# Altium schematic symbol library NXP_60_26022015.SCHLIB: 1306 symbols (part 4 of 28) (continued)
## 74HC4049D (continued)
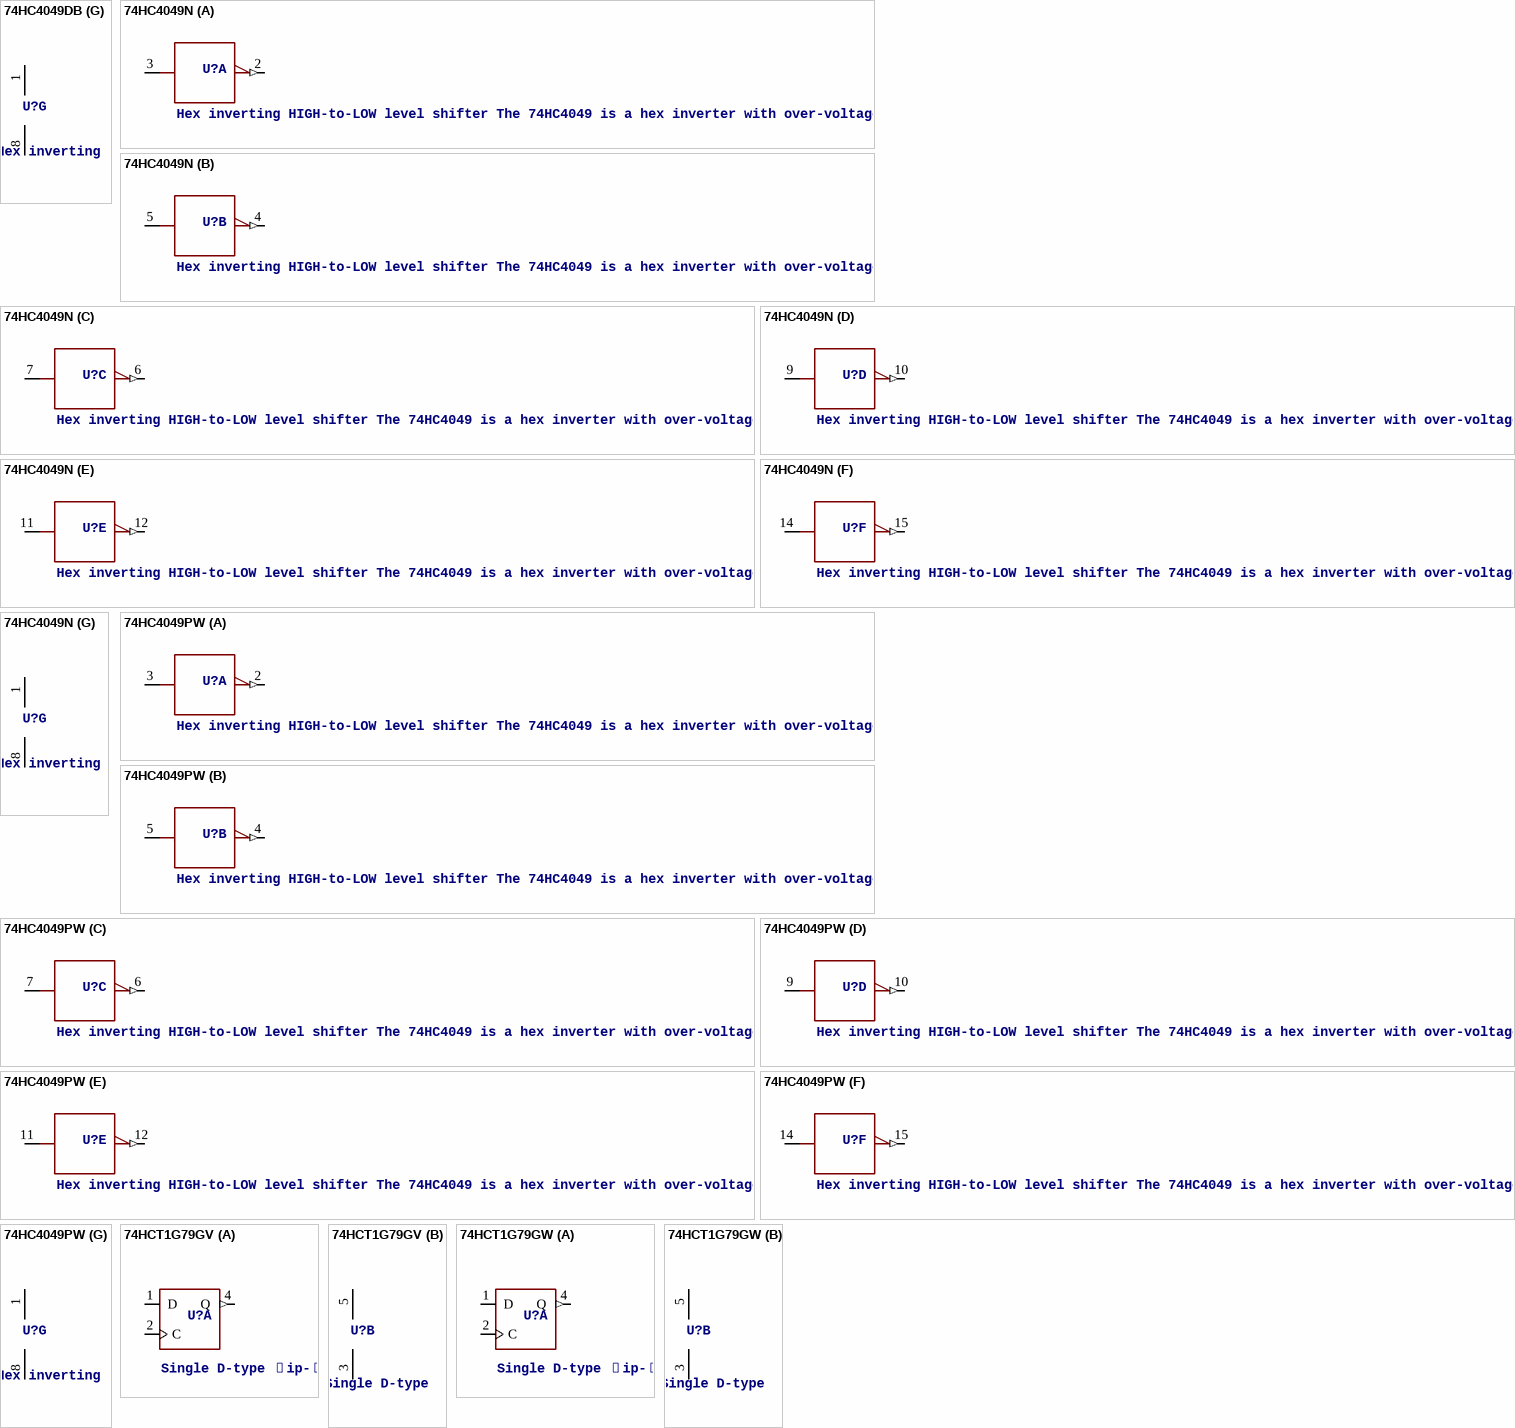
[diagram p18: symbols 74HC4049DB to 74HCT1G79GW]

## 74HC4049DB
designator U?, comment Hex inverting HIGH-to-LOW level shifter The 74HC4049 is a hex inverter with over-voltage tolerant inputs. Inputs are overvoltage tolerant to 15 V. This enables the device to be used in HIGH-to-LOW level shifting applications.    AAL Eindhoven MK
footprint SOT338
part A pins: 2 Y (out), 3 A
part B pins: 4 Y (out), 5 A
part C pins: 6 Y (out), 7 A
part D pins: 9 A, 10 Y (out)
part E pins: 11 A, 12 Y (out)
part F pins: 14 A, 15 Y (out)
part G pins: 1 VCC (power), 8 GND (power)

## 74HC4049N
designator U?, comment Hex inverting HIGH-to-LOW level shifter The 74HC4049 is a hex inverter with over-voltage tolerant inputs. Inputs are overvoltage tolerant to 15 V. This enables the device to be used in HIGH-to-LOW level shifting applications.    AAL Eindhoven MK
footprint SOT38
part A pins: 2 Y (out), 3 A
part B pins: 4 Y (out), 5 A
part C pins: 6 Y (out), 7 A
part D pins: 9 A, 10 Y (out)
part E pins: 11 A, 12 Y (out)
part F pins: 14 A, 15 Y (out)
part G pins: 1 VCC (power), 8 GND (power)

## 74HC4049PW
designator U?, comment Hex inverting HIGH-to-LOW level shifter The 74HC4049 is a hex inverter with over-voltage tolerant inputs. Inputs are overvoltage tolerant to 15 V. This enables the device to be used in HIGH-to-LOW level shifting applications.    AAL Eindhoven MK
footprint SOT403-1
part A pins: 2 Y (out), 3 A
part B pins: 4 Y (out), 5 A
part C pins: 6 Y (out), 7 A
part D pins: 9 A, 10 Y (out)
part E pins: 11 A, 12 Y (out)
part F pins: 14 A, 15 Y (out)
part G pins: 1 VCC (power), 8 GND (power)

## 74HCT1G79GV
designator U?, comment Single D-type ﬂip-ﬂop; positive-edge trigger 74AHC1G79 and 74AHCT1G79 are high-speed Si-gate CMOS devices. They provide a single positive-edge triggered D-type ﬂip-ﬂop. Information on the data input is transferred to the Q output on the LOW-to-HIGH transition of the clock pulse. The D input must be stable one set-up time prior to the LOW-to-HIGH clock transition for predictable operation. The AHC device has CMOS input switching levels and supply voltage range 2 V to 5.5 V. The AHCT device has TTL input switching levels and supply voltage range 4.5 V to 5.5 V    AAL Eindhoven MK
footprint SOT753
part A pins: 1 D, 2 C, 4 Q (out)
part B pins: 3 GND (power), 5 VCC (power)

## 74HCT1G79GW
designator U?, comment Single D-type ﬂip-ﬂop; positive-edge trigger 74AHC1G79 and 74AHCT1G79 are high-speed Si-gate CMOS devices. They provide a single positive-edge triggered D-type ﬂip-ﬂop. Information on the data input is transferred to the Q output on the LOW-to-HIGH transition of the clock pulse. The D input must be stable one set-up time prior to the LOW-to-HIGH clock transition for predictable operation. The AHC device has CMOS input switching levels and supply voltage range 2 V to 5.5 V. The AHCT device has TTL input switching levels and supply voltage range 4.5 V to 5.5 V    AAL Eindhoven MK
footprint SOT353-1
part A pins: 1 D, 2 C, 4 Q (out)
part B pins: 3 GND (power), 5 VCC (power)

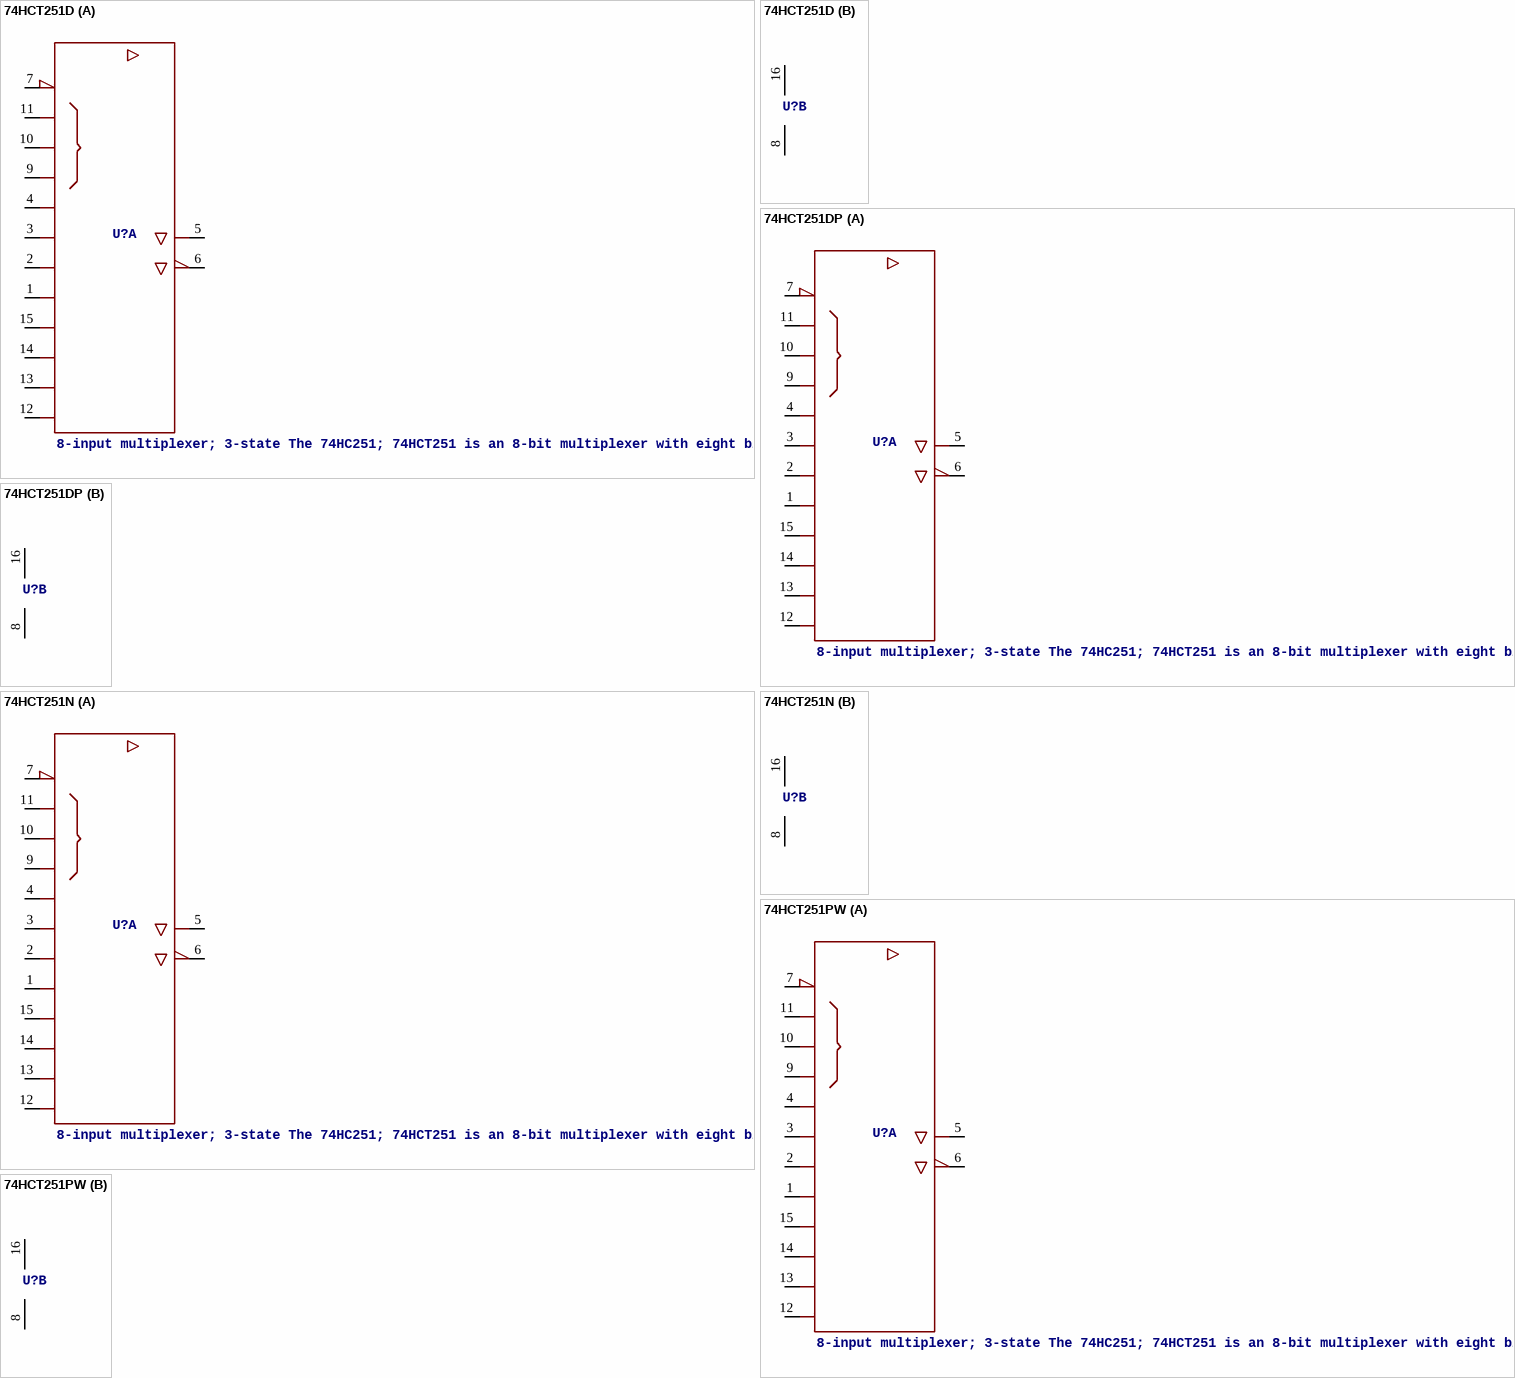
[diagram p19: symbols 74HCT251D to 74HCT251PW]

## 74HCT251D
designator U?, comment 8-input multiplexer; 3-state The 74HC251; 74HCT251 is an 8-bit multiplexer with eight binary inputs (I0 to I7), three select inputs (S0 to S2) and an output enable input (OE). The select inputs select one of the eight binary inputs and route it to the complementary outputs (Y and Y). A HIGH on OE causes the outputs to assume a high-impedance OFF-state. Inputs include clamp diodes that enable the use of current limiting resistors to interface inputs to voltages in excess of VCC.    AAL Eindhoven MK
footprint SOT109-1
part A pins: 1 D3, 2 D2, 3 D1, 4 D0, 5 Y (hiz), 6 W (hiz), 7 !G, 9 C, 10 B, 11 A, 12 D7, 13 D6, 14 D5, 15 D4
part B pins: 8 GND (power), 16 VCC (power)

## 74HCT251DP
designator U?, comment 8-input multiplexer; 3-state The 74HC251; 74HCT251 is an 8-bit multiplexer with eight binary inputs (I0 to I7), three select inputs (S0 to S2) and an output enable input (OE). The select inputs select one of the eight binary inputs and route it to the complementary outputs (Y and Y). A HIGH on OE causes the outputs to assume a high-impedance OFF-state. Inputs include clamp diodes that enable the use of current limiting resistors to interface inputs to voltages in excess of VCC.    AAL Eindhoven MK
footprint SOT338
part A pins: 1 D3, 2 D2, 3 D1, 4 D0, 5 Y (hiz), 6 W (hiz), 7 !G, 9 C, 10 B, 11 A, 12 D7, 13 D6, 14 D5, 15 D4
part B pins: 8 GND (power), 16 VCC (power)

## 74HCT251N
designator U?, comment 8-input multiplexer; 3-state The 74HC251; 74HCT251 is an 8-bit multiplexer with eight binary inputs (I0 to I7), three select inputs (S0 to S2) and an output enable input (OE). The select inputs select one of the eight binary inputs and route it to the complementary outputs (Y and Y). A HIGH on OE causes the outputs to assume a high-impedance OFF-state. Inputs include clamp diodes that enable the use of current limiting resistors to interface inputs to voltages in excess of VCC.    AAL Eindhoven MK
footprint SOT38
part A pins: 1 D3, 2 D2, 3 D1, 4 D0, 5 Y (hiz), 6 W (hiz), 7 !G, 9 C, 10 B, 11 A, 12 D7, 13 D6, 14 D5, 15 D4
part B pins: 8 GND (power), 16 VCC (power)

## 74HCT251PW
designator U?, comment 8-input multiplexer; 3-state The 74HC251; 74HCT251 is an 8-bit multiplexer with eight binary inputs (I0 to I7), three select inputs (S0 to S2) and an output enable input (OE). The select inputs select one of the eight binary inputs and route it to the complementary outputs (Y and Y). A HIGH on OE causes the outputs to assume a high-impedance OFF-state. Inputs include clamp diodes that enable the use of current limiting resistors to interface inputs to voltages in excess of VCC.    AAL Eindhoven MK
footprint SOT403-1
part A pins: 1 D3, 2 D2, 3 D1, 4 D0, 5 Y (hiz), 6 W (hiz), 7 !G, 9 C, 10 B, 11 A, 12 D7, 13 D6, 14 D5, 15 D4
part B pins: 8 GND (power), 16 VCC (power)

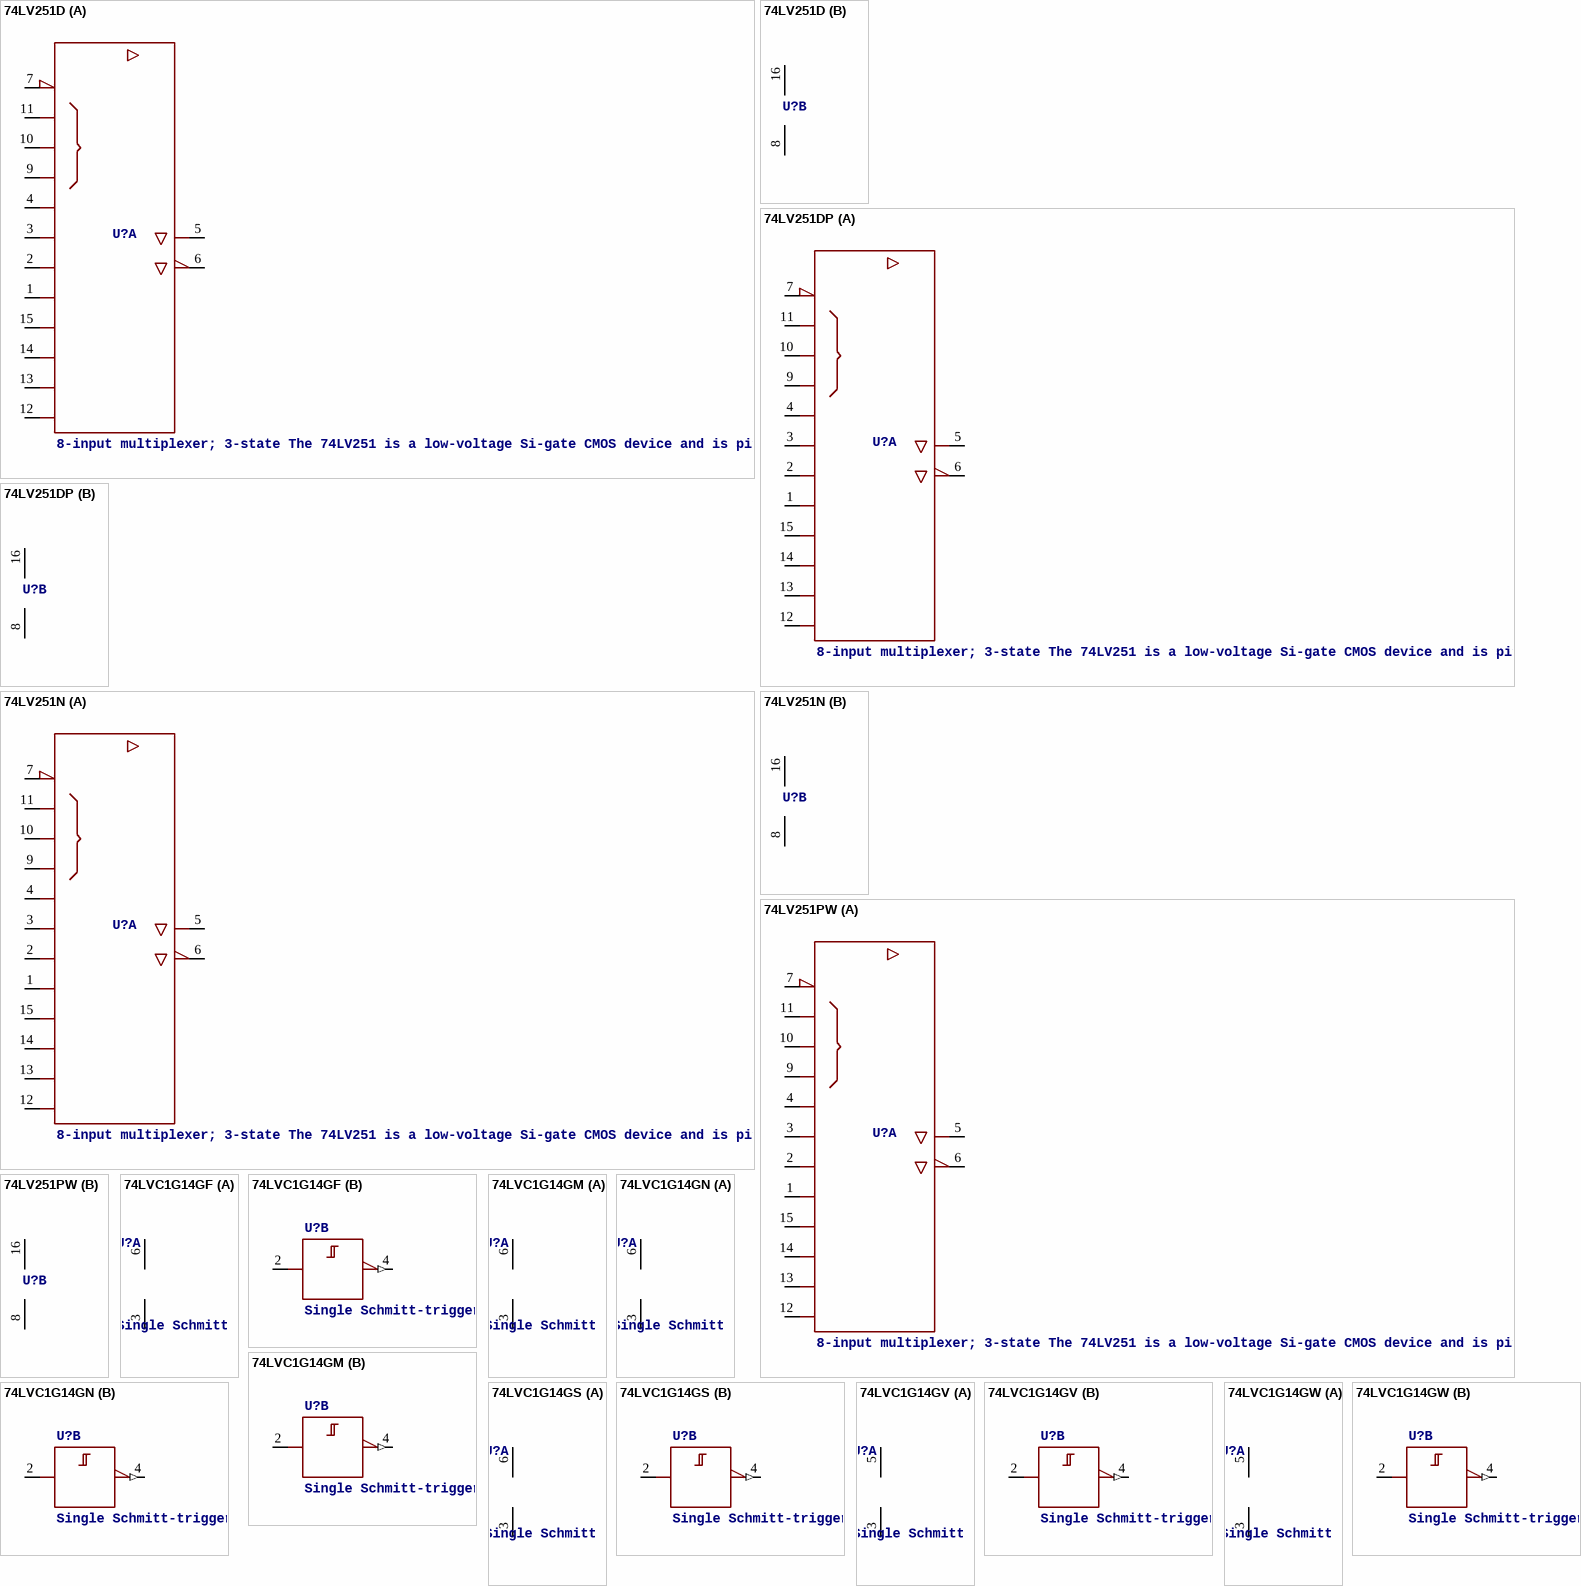
[diagram p20: symbols 74LV251D to 74LVC1G14GW]

## 74LV251D
designator U?, comment 8-input multiplexer; 3-state The 74LV251 is a low-voltage Si-gate CMOS device and is pin and function compatible with 74HC/HCT251. The 74LV251 is an 8-input multiplexer with 8 binary inputs (I0 to I7), an output enable input (OE) and three select inputs (S0, S1, S2). One of the eight binary inputs is selected by the select inputs and is routed to the outputs (Y, Y). Both outputs are in the high impedance OFF-state (Z) when the output enable input is HIGH, allowing multiplexer expansion by tying the outputs.    AAL Eindhoven MK
footprint SOT109-1
part A pins: 1 D3, 2 D2, 3 D1, 4 D0, 5 Y (hiz), 6 W (hiz), 7 !G, 9 C, 10 B, 11 A, 12 D7, 13 D6, 14 D5, 15 D4
part B pins: 8 GND (power), 16 VCC (power)

## 74LV251DP
designator U?, comment 8-input multiplexer; 3-state The 74LV251 is a low-voltage Si-gate CMOS device and is pin and function compatible with 74HC/HCT251. The 74LV251 is an 8-input multiplexer with 8 binary inputs (I0 to I7), an output enable input (OE) and three select inputs (S0, S1, S2). One of the eight binary inputs is selected by the select inputs and is routed to the outputs (Y, Y). Both outputs are in the high impedance OFF-state (Z) when the output enable input is HIGH, allowing multiplexer expansion by tying the outputs.    AAL Eindhoven MK
footprint SOT338
part A pins: 1 D3, 2 D2, 3 D1, 4 D0, 5 Y (hiz), 6 W (hiz), 7 !G, 9 C, 10 B, 11 A, 12 D7, 13 D6, 14 D5, 15 D4
part B pins: 8 GND (power), 16 VCC (power)

## 74LV251N
designator U?, comment 8-input multiplexer; 3-state The 74LV251 is a low-voltage Si-gate CMOS device and is pin and function compatible with 74HC/HCT251. The 74LV251 is an 8-input multiplexer with 8 binary inputs (I0 to I7), an output enable input (OE) and three select inputs (S0, S1, S2). One of the eight binary inputs is selected by the select inputs and is routed to the outputs (Y, Y). Both outputs are in the high impedance OFF-state (Z) when the output enable input is HIGH, allowing multiplexer expansion by tying the outputs.    AAL Eindhoven MK
footprint SOT38
part A pins: 1 D3, 2 D2, 3 D1, 4 D0, 5 Y (hiz), 6 W (hiz), 7 !G, 9 C, 10 B, 11 A, 12 D7, 13 D6, 14 D5, 15 D4
part B pins: 8 GND (power), 16 VCC (power)

## 74LV251PW
designator U?, comment 8-input multiplexer; 3-state The 74LV251 is a low-voltage Si-gate CMOS device and is pin and function compatible with 74HC/HCT251. The 74LV251 is an 8-input multiplexer with 8 binary inputs (I0 to I7), an output enable input (OE) and three select inputs (S0, S1, S2). One of the eight binary inputs is selected by the select inputs and is routed to the outputs (Y, Y). Both outputs are in the high impedance OFF-state (Z) when the output enable input is HIGH, allowing multiplexer expansion by tying the outputs.    AAL Eindhoven MK
footprint SOT403-1
part A pins: 1 D3, 2 D2, 3 D1, 4 D0, 5 Y (hiz), 6 W (hiz), 7 !G, 9 C, 10 B, 11 A, 12 D7, 13 D6, 14 D5, 15 D4
part B pins: 8 GND (power), 16 VCC (power)

## 74LVC1G14GF
designator U?, comment Single Schmitt-trigger inverter The 74LVC1G14 provides the inverting buffer function with Schmitt-trigger input. It is capable of transforming slowly changing input signals into sharply defined, jitter-free output signals. The input can be driven from either 3.3 V or 5 V devices. This feature allows the use of this device in a mixed 3.3 V and 5 V environment. Schmitt-trigger action at the input makes the circuit tolerant for slower input rise and fall time. This device is fully specified for partial power-down applications using IOFF. The IOFF circuitry disables the output, preventing the damaging backflow current through the device when it is powered down.    AAL Eindhoven MK
12NC: 9352 824 12132
footprint SOT891
part A pins: 3 GND (power), 6 VCC (power)
part B pins: 2 A, 4 Y (out)

## 74LVC1G14GM
designator U?, comment Single Schmitt-trigger inverter The 74LVC1G14 provides the inverting buffer function with Schmitt-trigger input. It is capable of transforming slowly changing input signals into sharply defined, jitter-free output signals. The input can be driven from either 3.3 V or 5 V devices. This feature allows the use of this device in a mixed 3.3 V and 5 V environment. Schmitt-trigger action at the input makes the circuit tolerant for slower input rise and fall time. This device is fully specified for partial power-down applications using IOFF. The IOFF circuitry disables the output, preventing the damaging backflow current through the device when it is powered down.    AAL Eindhoven MK
12NC: 9352 771 79115
footprint SOT886
part A pins: 3 GND (power), 6 VCC (power)
part B pins: 2 A, 4 Y (out)

## 74LVC1G14GN
designator U?, comment Single Schmitt-trigger inverter The 74LVC1G14 provides the inverting buffer function with Schmitt-trigger input. It is capable of transforming slowly changing input signals into sharply defined, jitter-free output signals. The input can be driven from either 3.3 V or 5 V devices. This feature allows the use of this device in a mixed 3.3 V and 5 V environment. Schmitt-trigger action at the input makes the circuit tolerant for slower input rise and fall time. This device is fully specified for partial power-down applications using IOFF. The IOFF circuitry disables the output, preventing the damaging backflow current through the device when it is powered down.    AAL Eindhoven MK
12NC: 9352 917 77132
footprint SOT1115
part A pins: 3 GND (power), 6 VCC (power)
part B pins: 2 A, 4 Y (out)

## 74LVC1G14GS
designator U?, comment Single Schmitt-trigger inverter The 74LVC1G14 provides the inverting buffer function with Schmitt-trigger input. It is capable of transforming slowly changing input signals into sharply defined, jitter-free output signals. The input can be driven from either 3.3 V or 5 V devices. This feature allows the use of this device in a mixed 3.3 V and 5 V environment. Schmitt-trigger action at the input makes the circuit tolerant for slower input rise and fall time. This device is fully specified for partial power-down applications using IOFF. The IOFF circuitry disables the output, preventing the damaging backflow current through the device when it is powered down.    AAL Eindhoven MK
12NC: 9352 929 03132
footprint SOT1202
part A pins: 3 GND (power), 6 VCC (power)
part B pins: 2 A, 4 Y (out)

## 74LVC1G14GV
designator U?, comment Single Schmitt-trigger inverter The 74LVC1G14 provides the inverting buffer function with Schmitt-trigger input. It is capable of transforming slowly changing input signals into sharply defined, jitter-free output signals. The input can be driven from either 3.3 V or 5 V devices. This feature allows the use of this device in a mixed 3.3 V and 5 V environment. Schmitt-trigger action at the input makes the circuit tolerant for slower input rise and fall time. This device is fully specified for partial power-down applications using IOFF. The IOFF circuitry disables the output, preventing the damaging backflow current through the device when it is powered down.    AAL Eindhoven MK
12NC: 9352 720 19125
footprint SOT753
part A pins: 3 GND (power), 5 VCC (power)
part B pins: 2 A, 4 Y (out)

## 74LVC1G14GW
designator U?, comment Single Schmitt-trigger inverter The 74LVC1G14 provides the inverting buffer function with Schmitt-trigger input. It is capable of transforming slowly changing input signals into sharply defined, jitter-free output signals. The input can be driven from either 3.3 V or 5 V devices. This feature allows the use of this device in a mixed 3.3 V and 5 V environment. Schmitt-trigger action at the input makes the circuit tolerant for slower input rise and fall time. This device is fully specified for partial power-down applications using IOFF. The IOFF circuitry disables the output, preventing the damaging backflow current through the device when it is powered down.    AAL Eindhoven MK
12NC: 9352 685 95125
footprint SOT353-1
part A pins: 3 GND (power), 5 VCC (power)
part B pins: 2 A, 4 Y (out)

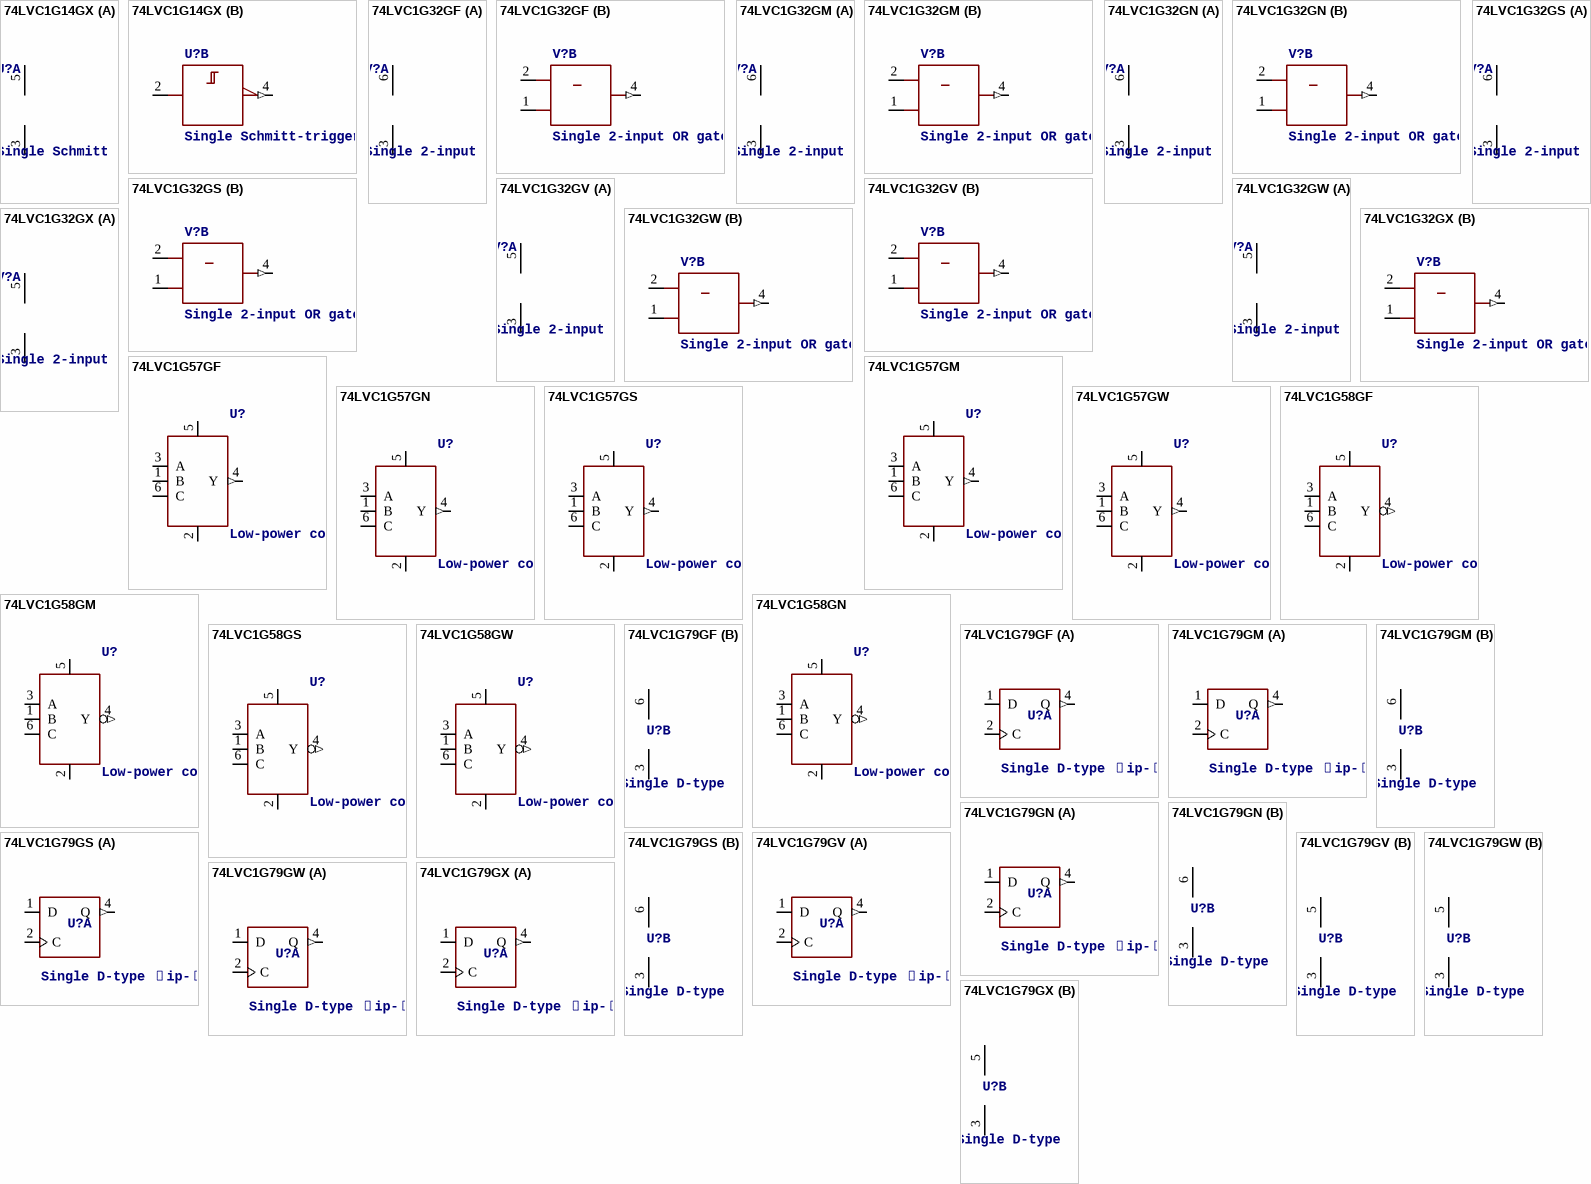
[diagram p21: symbols 74LVC1G14GX to 74LVC1G79GX]

## 74LVC1G14GX
designator U?, comment Single Schmitt-trigger inverter The 74LVC1G14 provides the inverting buffer function with Schmitt-trigger input. It is capable of transforming slowly changing input signals into sharply defined, jitter-free output signals. The input can be driven from either 3.3 V or 5 V devices. This feature allows the use of this device in a mixed 3.3 V and 5 V environment. Schmitt-trigger action at the input makes the circuit tolerant for slower input rise and fall time. This device is fully specified for partial power-down applications using IOFF. The IOFF circuitry disables the output, preventing the damaging backflow current through the device when it is powered down.    AAL Eindhoven MK
footprint SOT1226
part A pins: 3 GND (power), 5 VCC (power)
part B pins: 2 A, 4 Y (out)

## 74LVC1G32GF
designator V?, comment Single 2-input OR gate  The 74LVC1G32 provides one 2-input OR function. Inputs can be driven from either 3.3 V or 5 V devices. This feature allows the use of these devices as translators in mixed 3.3 V and 5 V applications. Schmitt trigger action at all inputs makes the circuit tolerant of slower input rise and fall time. This device is fully specified for partial power-down applications using IOFF. The IOFF circuitry disables the output, preventing the damaging backflow current through the device when it is powered down.   AAL Eindhoven MK
footprint SOT891
part A pins: 3 GND (power), 6 VCC (power)
part B pins: 1 B, 2 A, 4 Y (out)

## 74LVC1G32GM
designator V?, comment Single 2-input OR gate  The 74LVC1G32 provides one 2-input OR function. Inputs can be driven from either 3.3 V or 5 V devices. This feature allows the use of these devices as translators in mixed 3.3 V and 5 V applications. Schmitt trigger action at all inputs makes the circuit tolerant of slower input rise and fall time. This device is fully specified for partial power-down applications using IOFF. The IOFF circuitry disables the output, preventing the damaging backflow current through the device when it is powered down.   AAL Eindhoven MK
footprint SOT886
part A pins: 3 GND (power), 6 VCC (power)
part B pins: 1 B, 2 A, 4 Y (out)

## 74LVC1G32GN
designator V?, comment Single 2-input OR gate  The 74LVC1G32 provides one 2-input OR function. Inputs can be driven from either 3.3 V or 5 V devices. This feature allows the use of these devices as translators in mixed 3.3 V and 5 V applications. Schmitt trigger action at all inputs makes the circuit tolerant of slower input rise and fall time. This device is fully specified for partial power-down applications using IOFF. The IOFF circuitry disables the output, preventing the damaging backflow current through the device when it is powered down.   AAL Eindhoven MK
footprint SOT1115
part A pins: 3 GND (power), 6 VCC (power)
part B pins: 1 B, 2 A, 4 Y (out)

## 74LVC1G32GS
designator V?, comment Single 2-input OR gate  The 74LVC1G32 provides one 2-input OR function. Inputs can be driven from either 3.3 V or 5 V devices. This feature allows the use of these devices as translators in mixed 3.3 V and 5 V applications. Schmitt trigger action at all inputs makes the circuit tolerant of slower input rise and fall time. This device is fully specified for partial power-down applications using IOFF. The IOFF circuitry disables the output, preventing the damaging backflow current through the device when it is powered down.   AAL Eindhoven MK
footprint SOT1202
part A pins: 3 GND (power), 6 VCC (power)
part B pins: 1 B, 2 A, 4 Y (out)

## 74LVC1G32GV
designator V?, comment Single 2-input OR gate  The 74LVC1G32 provides one 2-input OR function. Inputs can be driven from either 3.3 V or 5 V devices. This feature allows the use of these devices as translators in mixed 3.3 V and 5 V applications. Schmitt trigger action at all inputs makes the circuit tolerant of slower input rise and fall time. This device is fully specified for partial power-down applications using IOFF. The IOFF circuitry disables the output, preventing the damaging backflow current through the device when it is powered down.   AAL Eindhoven MK
footprint SOT753
part A pins: 3 GND (power), 5 VCC (power)
part B pins: 1 B, 2 A, 4 Y (out)

## 74LVC1G32GW
designator V?, comment Single 2-input OR gate  The 74LVC1G32 provides one 2-input OR function. Inputs can be driven from either 3.3 V or 5 V devices. This feature allows the use of these devices as translators in mixed 3.3 V and 5 V applications. Schmitt trigger action at all inputs makes the circuit tolerant of slower input rise and fall time. This device is fully specified for partial power-down applications using IOFF. The IOFF circuitry disables the output, preventing the damaging backflow current through the device when it is powered down.   AAL Eindhoven MK
footprint SOT353-1
part A pins: 3 GND (power), 5 VCC (power)
part B pins: 1 B, 2 A, 4 Y (out)

## 74LVC1G32GX
designator V?, comment Single 2-input OR gate  The 74LVC1G32 provides one 2-input OR function. Inputs can be driven from either 3.3 V or 5 V devices. This feature allows the use of these devices as translators in mixed 3.3 V and 5 V applications. Schmitt trigger action at all inputs makes the circuit tolerant of slower input rise and fall time. This device is fully specified for partial power-down applications using IOFF. The IOFF circuitry disables the output, preventing the damaging backflow current through the device when it is powered down.   AAL Eindhoven MK
footprint SOT1226
part A pins: 3 GND (power), 5 VCC (power)
part B pins: 1 B, 2 A, 4 Y (out)

## 74LVC1G57GF
designator U?, comment Low-power configurable multiple function gate The 74LVC1G57 provides configurable multiple functions. The output state is determined by eight patterns of 3-bit input. The user can choose the logic functions AND, OR, NAND, NOR, XNOR, inverter and buffer. All inputs can be connected to VCC or GND. Inputs can be driven from either 3.3 V or 5 V devices. This feature allows the use of this device in a mixed 3.3 V and 5 V environment. This device is fully specified for partial power-down applications using IOFF. The IOFF circuitry disables the output, preventing the damaging backflow current through the device when it is powered down. All inputs (A, B and C) are Schmitt trigger inputs. They are capable of transforming slowly changing input signals into sharply defined, jitter-free output signals.   AAL Eindhoven MK
12NC: 9352 813 28132
footprint SOT891
pins: 1 B, 2 GND (power), 3 A, 4 Y (out), 5 VCC (power), 6 C

## 74LVC1G57GM
designator U?, comment Low-power configurable multiple function gate The 74LVC1G57 provides configurable multiple functions. The output state is determined by eight patterns of 3-bit input. The user can choose the logic functions AND, OR, NAND, NOR, XNOR, inverter and buffer. All inputs can be connected to VCC or GND. Inputs can be driven from either 3.3 V or 5 V devices. This feature allows the use of this device in a mixed 3.3 V and 5 V environment. This device is fully specified for partial power-down applications using IOFF. The IOFF circuitry disables the output, preventing the damaging backflow current through the device when it is powered down. All inputs (A, B and C) are Schmitt trigger inputs. They are capable of transforming slowly changing input signals into sharply defined, jitter-free output signals.   AAL Eindhoven MK
12NC: 9352 799 58132
footprint SOT886
pins: 1 B, 2 GND (power), 3 A, 4 Y (out), 5 VCC (power), 6 C

## 74LVC1G57GN
designator U?, comment Low-power configurable multiple function gate The 74LVC1G57 provides configurable multiple functions. The output state is determined by eight patterns of 3-bit input. The user can choose the logic functions AND, OR, NAND, NOR, XNOR, inverter and buffer. All inputs can be connected to VCC or GND. Inputs can be driven from either 3.3 V or 5 V devices. This feature allows the use of this device in a mixed 3.3 V and 5 V environment. This device is fully specified for partial power-down applications using IOFF. The IOFF circuitry disables the output, preventing the damaging backflow current through the device when it is powered down. All inputs (A, B and C) are Schmitt trigger inputs. They are capable of transforming slowly changing input signals into sharply defined, jitter-free output signals.   AAL Eindhoven MK
I2C: 9352 917 43132
footprint SOT1115
pins: 1 B, 2 GND (power), 3 A, 4 Y (out), 5 VCC (power), 6 C

## 74LVC1G57GS
designator U?, comment Low-power configurable multiple function gate The 74LVC1G57 provides configurable multiple functions. The output state is determined by eight patterns of 3-bit input. The user can choose the logic functions AND, OR, NAND, NOR, XNOR, inverter and buffer. All inputs can be connected to VCC or GND. Inputs can be driven from either 3.3 V or 5 V devices. This feature allows the use of this device in a mixed 3.3 V and 5 V environment. This device is fully specified for partial power-down applications using IOFF. The IOFF circuitry disables the output, preventing the damaging backflow current through the device when it is powered down. All inputs (A, B and C) are Schmitt trigger inputs. They are capable of transforming slowly changing input signals into sharply defined, jitter-free output signals.   AAL Eindhoven MK
12NC: 9352 928 67132
footprint SOT1202
pins: 1 B, 2 GND (power), 3 A, 4 Y (out), 5 VCC (power), 6 C

## 74LVC1G57GW
designator U?, comment Low-power configurable multiple function gate The 74LVC1G57 provides configurable multiple functions. The output state is determined by eight patterns of 3-bit input. The user can choose the logic functions AND, OR, NAND, NOR, XNOR, inverter and buffer. All inputs can be connected to VCC or GND. Inputs can be driven from either 3.3 V or 5 V devices. This feature allows the use of this device in a mixed 3.3 V and 5 V environment. This device is fully specified for partial power-down applications using IOFF. The IOFF circuitry disables the output, preventing the damaging backflow current through the device when it is powered down. All inputs (A, B and C) are Schmitt trigger inputs. They are capable of transforming slowly changing input signals into sharply defined, jitter-free output signals.   AAL Eindhoven MK
12NC: 9352 799 57125
footprint SOT363
pins: 1 B, 2 GND (power), 3 A, 4 Y (out), 5 VCC (power), 6 C

## 74LVC1G58GF
designator U?, comment Low-power configurable multiple function gate The 74LVC1G58 provides configurable multiple functions. The output state is determined by eight patterns of 3-bit input. The user can choose the logic functions AND, OR, NAND, NOR, XOR, inverter and buffer. All inputs can be connected to VCC or GND. Inputs can be driven from either 3.3 V or 5 V devices. This feature allows the use of this device in a mixed 3.3 V and 5 V environment. This device is fully specified for partial power-down applications using IOFF. The IOFF circuitry disables the output, preventing the damaging backflow current through the device when it is powered down. All inputs (A, B and C) are Schmitt trigger inputs. They are capable of transforming slowly changing input signals into sharply defined, jitter-free output signals.   AAL Eindhoven MK
12NC: 9352 813 29132
footprint SOT891
pins: 1 B, 2 GND (power), 3 A, 4 Y (out), 5 VCC (power), 6 C

## 74LVC1G58GM
designator U?, comment Low-power configurable multiple function gate The 74LVC1G58 provides configurable multiple functions. The output state is determined by eight patterns of 3-bit input. The user can choose the logic functions AND, OR, NAND, NOR, XOR, inverter and buffer. All inputs can be connected to VCC or GND. Inputs can be driven from either 3.3 V or 5 V devices. This feature allows the use of this device in a mixed 3.3 V and 5 V environment. This device is fully specified for partial power-down applications using IOFF. The IOFF circuitry disables the output, preventing the damaging backflow current through the device when it is powered down. All inputs (A, B and C) are Schmitt trigger inputs. They are capable of transforming slowly changing input signals into sharply defined, jitter-free output signals.   AAL Eindhoven MK
12NC: 9352 799 61132
footprint SOT886
pins: 1 B, 2 GND (power), 3 A, 4 Y (out), 5 VCC (power), 6 C

## 74LVC1G58GN
designator U?, comment Low-power configurable multiple function gate The 74LVC1G58 provides configurable multiple functions. The output state is determined by eight patterns of 3-bit input. The user can choose the logic functions AND, OR, NAND, NOR, XOR, inverter and buffer. All inputs can be connected to VCC or GND. Inputs can be driven from either 3.3 V or 5 V devices. This feature allows the use of this device in a mixed 3.3 V and 5 V environment. This device is fully specified for partial power-down applications using IOFF. The IOFF circuitry disables the output, preventing the damaging backflow current through the device when it is powered down. All inputs (A, B and C) are Schmitt trigger inputs. They are capable of transforming slowly changing input signals into sharply defined, jitter-free output signals.   AAL Eindhoven MK
I2C: 9352 917 44132
footprint SOT1115
pins: 1 B, 2 GND (power), 3 A, 4 Y (out), 5 VCC (power), 6 C